# Altium footprint library ICL_komponenty_v1.PcbLib: 160 footprints (part 7 of 10)
Each footprint in its own frame and in the unit in brackets; x right, y up, seen from the top. Pads: shape width x height; smd on the part's side, far side on the other; paste and mask are expansions set on the pad; w line width, h text height; cw(c..) or ccw(c..) is an arc to the next point about the centre after c.
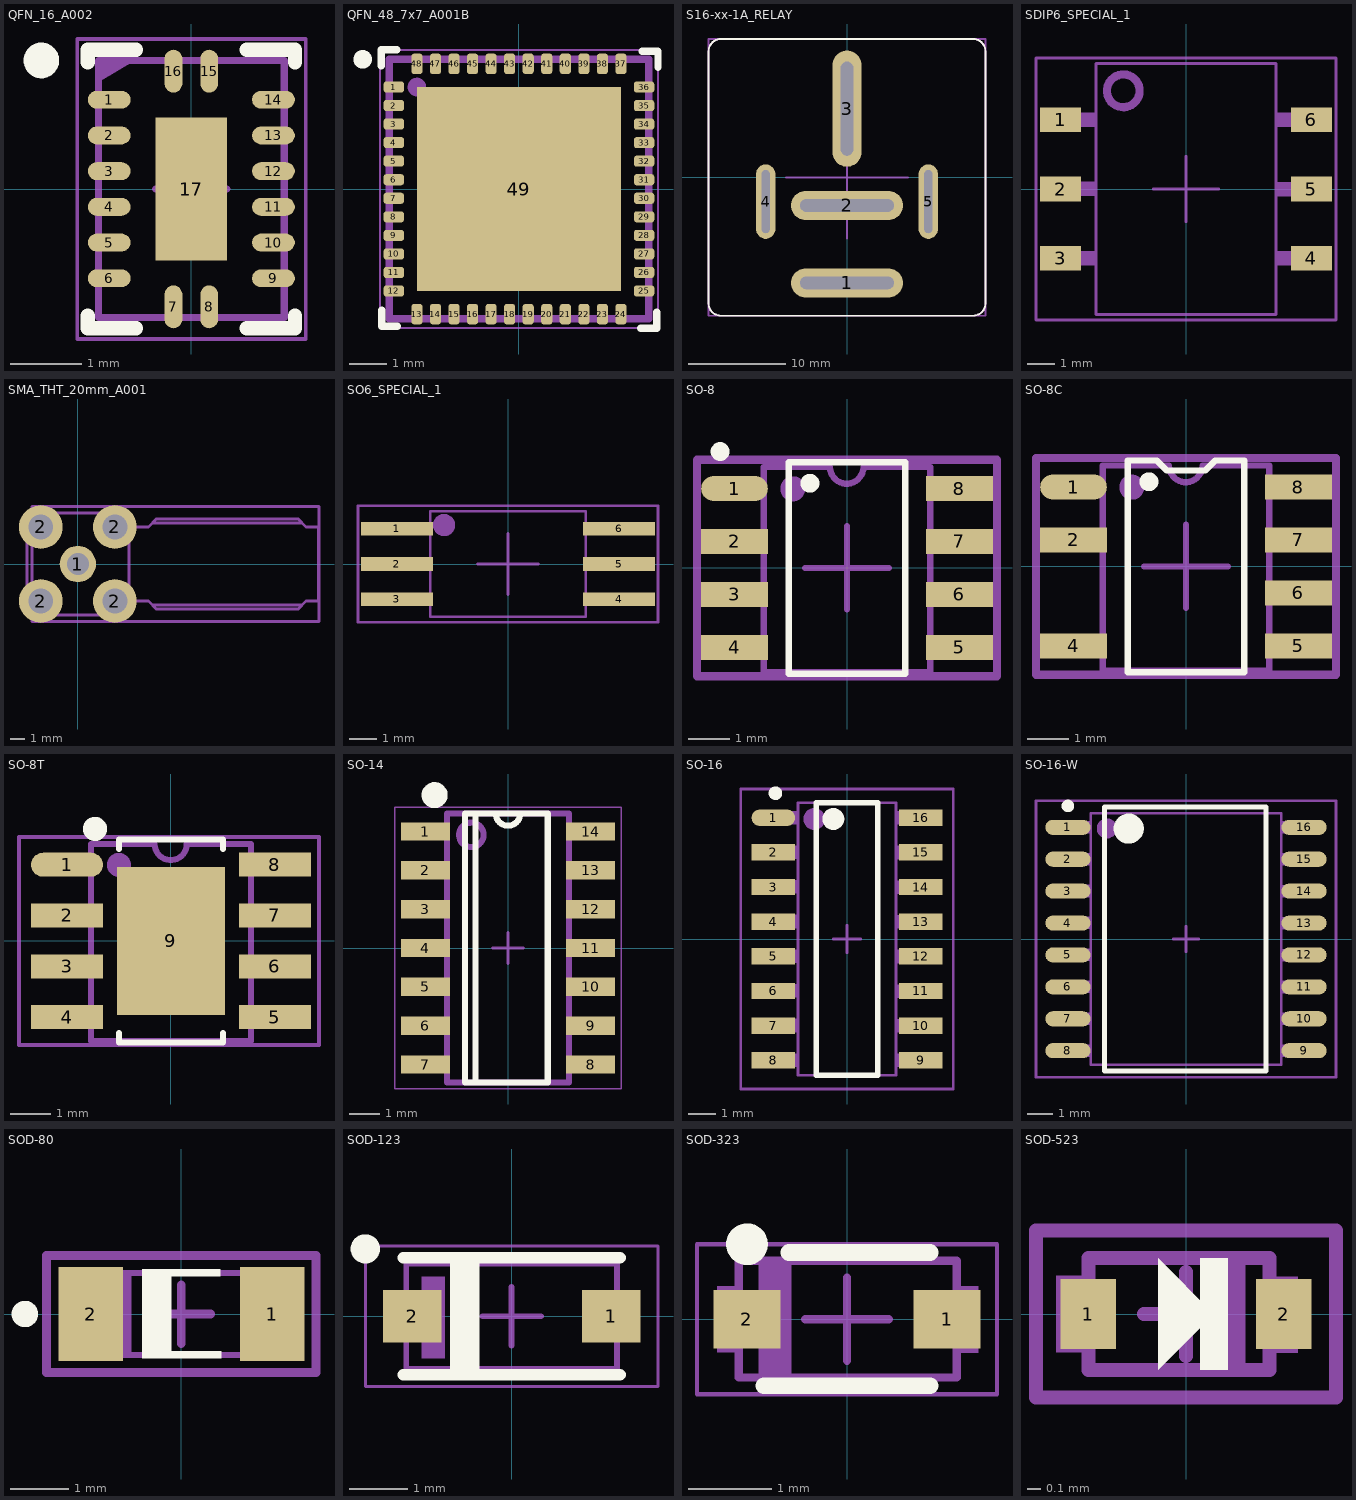
[diagram p6: the footprints below, top view; thin cyan lines are the x and y axes]

## QFN_16_A002 [mm] "QFN 16 for 74xx series"
height 0.8
pads (17):
  oval 0.6x0.25 smd: 1(-1.15,1.25) 2(-1.15,0.75) 3(-1.15,0.25) 4(-1.15,-0.25) 5(-1.15,-0.75) 6(-1.15,-1.25) 9(1.15,-1.25) 10(1.15,-0.75) 11(1.15,-0.25) 12(1.15,0.25) 13(1.15,0.75) 14(1.15,1.25)
  oval 0.25x0.6 smd: 7(-0.25,-1.65) 8(0.25,-1.65) 15(0.25,1.65) 16(-0.25,1.65)
  rect 1x2 smd: 17(0,0)
Top Overlay:
  circle w0.25: c-2.1,1.8 r0.125
  lines w0.2: -1.45,-1.775 -1.45,-1.95 -0.775,-1.95 ; -1.45,1.775 -1.45,1.95 -0.775,1.95 ; 0.775,-1.95 1.45,-1.95 1.45,-1.775 ; 0.775,1.95 1.45,1.95 1.45,1.775
Top M11-12_SMOT:
  region: -0.337,1.8 -0.337,1.5 -0.158,1.5 -0.158,1.8
  region: 0.163,1.8 0.163,1.5 0.342,1.5 0.342,1.8
  region: 1.3,1.337 1,1.337 1,1.158 1.3,1.158
  region: 1.3,0.837 1,0.837 1,0.658 1.3,0.658
  region: 1.3,0.337 1,0.337 1,0.158 1.3,0.158
  region: 1.3,-0.163 1,-0.163 1,-0.342 1.3,-0.342
  region: 1.3,-0.663 1,-0.663 1,-0.842 1.3,-0.842
  region: 1.3,-1.163 1,-1.163 1,-1.342 1.3,-1.342
  region: 0.337,-1.8 0.337,-1.5 0.158,-1.5 0.158,-1.8
  region: -0.163,-1.8 -0.163,-1.5 -0.342,-1.5 -0.342,-1.8
  rectangle: -1.3,-1.337 -1,-1.158
  rectangle: -1.3,-0.837 -1,-0.658
  rectangle: -1.3,-0.337 -1,-0.158
  rectangle: -1.3,0.163 -1,0.342
  rectangle: -1.3,0.663 -1,0.842
  rectangle: -1.3,1.163 -1,1.342
  region: -1.3,1.496 -0.783,1.8 -1.006,1.8 -1.3,1.8
  lines w0.1: -1.3,-1.8 -1.3,1.8 1.3,1.8 1.3,-1.8 -1.3,-1.8
Top M15-16_SORG:
  lines w0.05: -1.6,-2.1 -1.6,2.1 1.6,2.1 1.6,-2.1 -1.6,-2.1
  lines w0.1: -0.5,0 0.5,0 ; 0,-0.5 0,0.5
3D body "QFN_16_A002.step": height 0.8, standoff 0, extent -1.31,-1.81 1.31,1.81

## QFN_48_7x7_A001B [mm] "ST"
height 0.8
pads (49):
  rrect50% 0.55x0.3 smd paste-0.035 mask+0.1: 1(-3.375,2.75) 2(-3.375,2.25) 3(-3.375,1.75) 4(-3.375,1.25) 5(-3.375,0.75) 6(-3.375,0.25) 7(-3.375,-0.25) 8(-3.375,-0.75) 9(-3.375,-1.25) 10(-3.375,-1.75) 11(-3.375,-2.25) 12(-3.375,-2.75) 25(3.375,-2.75) 26(3.375,-2.25) 27(3.375,-1.75) 28(3.375,-1.25) 29(3.375,-0.75) 30(3.375,-0.25) 31(3.375,0.25) 32(3.375,0.75) 33(3.375,1.25) 34(3.375,1.75) 35(3.375,2.25) 36(3.375,2.75)
  rrect50% 0.3x0.55 smd paste-0.035 mask+0.1: 13(-2.75,-3.375) 14(-2.25,-3.375) 15(-1.75,-3.375) 16(-1.25,-3.375) 17(-0.75,-3.375) 18(-0.25,-3.375) 19(0.25,-3.375) 20(0.75,-3.375) 21(1.25,-3.375) 22(1.75,-3.375) 23(2.25,-3.375) 24(2.75,-3.375) 37(2.75,3.375) 38(2.25,3.375) 39(1.75,3.375) 40(1.25,3.375) 41(0.75,3.375) 42(0.25,3.375) 43(-0.25,3.375) 44(-0.75,3.375) 45(-1.25,3.375) 46(-1.75,3.375) 47(-2.25,3.375) 48(-2.75,3.375)
  rect 5.5x5.5 smd paste-2.75 mask+0.1: 49(0,0)
Top Overlay:
  circle w0.25: c-4.215,3.496 r0.125
  lines w0.2: -3.713,3.325 -3.713,3.75 -3.288,3.75 ; -3.7,-3.275 -3.7,-3.7 -3.275,-3.7 ; 3.287,-3.75 3.712,-3.75 3.712,-3.325 ; 3.325,3.712 3.75,3.712 3.75,3.287
Top Paste:
  rectangle: -2.5,1.25 -1.25,2.5
  region: -1.25,-2.5 -1.25,-1.25 -2.5,-1.25 -2.5,-2.5
  region: 2.5,-1.25 1.25,-1.25 1.25,-2.5 2.5,-2.5
  region: 1.25,2.5 1.25,1.25 2.5,1.25 2.5,2.5
  rectangle: -0.75,1.25 0.75,2.5
  region: -1.25,-0.75 -1.25,0.75 -2.5,0.75 -2.5,-0.75
  region: 0.75,-1.25 -0.75,-1.25 -0.75,-2.5 0.75,-2.5
  region: 1.25,0.75 1.25,-0.75 2.5,-0.75 2.5,0.75
  region: -0.75,0.75 -0.75,-0.75 0.75,-0.75 0.75,0.75
Top Solder:
  rectangle: 0.8,-0.8 1.8,0.8
  region: 0.8,0.8 0.8,1.8 -0.8,1.8 -0.8,0.8
  region: -0.8,0.8 -1.8,0.8 -1.8,-0.8 -0.8,-0.8
  region: -0.8,-0.8 -0.8,-1.8 0.8,-1.8 0.8,-0.8
  region: 0.974,1.118 0.974,1.114 0.976,1.088 0.997,1.038 1.035,1.001 1.084,0.98 1.111,0.978 1.1,0.978 1.1,0.7 0.6,0.7 0.6,1.119
  region: -1.118,0.974 -1.114,0.974 -1.088,0.976 -1.038,0.997 -1.001,1.035 -0.98,1.084 -0.978,1.111 -0.978,1.1 -0.7,1.1 -0.7,0.6 -1.119,0.6
  region: -0.974,-1.118 -0.974,-1.114 -0.976,-1.088 -0.997,-1.038 -1.035,-1.001 -1.084,-0.98 -1.111,-0.978 -1.1,-0.978 -1.1,-0.7 -0.6,-0.7 -0.6,-1.119
  region: 1.118,-0.974 1.114,-0.974 1.088,-0.976 1.038,-0.997 1.001,-1.035 0.98,-1.084 0.978,-1.111 0.978,-1.1 0.7,-1.1 0.7,-0.6 1.119,-0.6
Top M11-12_SMOT:
  circle w0.25: c-2.75,2.75 r0.125
  region: -2.65,-3.171 -2.85,-3.171 -2.85,-3.62 -2.65,-3.62
  region: -2.15,-3.171 -2.35,-3.171 -2.35,-3.62 -2.15,-3.62
  region: -1.65,-3.171 -1.85,-3.171 -1.85,-3.62 -1.65,-3.62
  region: -1.15,-3.171 -1.35,-3.171 -1.35,-3.62 -1.15,-3.62
  region: -0.65,-3.171 -0.85,-3.171 -0.85,-3.62 -0.65,-3.62
  region: -0.15,-3.171 -0.35,-3.171 -0.35,-3.62 -0.15,-3.62
  region: 0.35,-3.171 0.15,-3.171 0.15,-3.62 0.35,-3.62
  region: 0.85,-3.171 0.65,-3.171 0.65,-3.62 0.85,-3.62
  region: 1.35,-3.171 1.15,-3.171 1.15,-3.62 1.35,-3.62
  region: 1.85,-3.171 1.65,-3.171 1.65,-3.62 1.85,-3.62
  region: 2.35,-3.171 2.15,-3.171 2.15,-3.62 2.35,-3.62
  region: 2.85,-3.171 2.65,-3.171 2.65,-3.62 2.85,-3.62
  region: 3.171,-2.65 3.171,-2.85 3.62,-2.85 3.62,-2.65
  region: 3.171,-2.15 3.171,-2.35 3.62,-2.35 3.62,-2.15
  region: 3.171,-1.65 3.171,-1.85 3.62,-1.85 3.62,-1.65
  region: 3.171,-1.15 3.171,-1.35 3.62,-1.35 3.62,-1.15
  region: 3.171,-0.65 3.171,-0.85 3.62,-0.85 3.62,-0.65
  region: 3.171,-0.15 3.171,-0.35 3.62,-0.35 3.62,-0.15
  region: 3.171,0.35 3.171,0.15 3.62,0.15 3.62,0.35
  region: 3.171,0.85 3.171,0.65 3.62,0.65 3.62,0.85
  region: 3.171,1.35 3.171,1.15 3.62,1.15 3.62,1.35
  region: 3.171,1.85 3.171,1.65 3.62,1.65 3.62,1.85
  region: 3.171,2.35 3.171,2.15 3.62,2.15 3.62,2.35
  region: 3.171,2.85 3.171,2.65 3.62,2.65 3.62,2.85
  rectangle: 2.65,3.171 2.85,3.62
  rectangle: 2.15,3.171 2.35,3.62
  rectangle: 1.65,3.171 1.85,3.62
  rectangle: 1.15,3.171 1.35,3.62
  rectangle: 0.65,3.171 0.85,3.62
  rectangle: 0.15,3.171 0.35,3.62
  rectangle: -0.35,3.171 -0.15,3.62
  rectangle: -0.85,3.171 -0.65,3.62
  rectangle: -1.35,3.171 -1.15,3.62
  rectangle: -1.85,3.171 -1.65,3.62
  rectangle: -2.35,3.171 -2.15,3.62
  rectangle: -2.85,3.171 -2.65,3.62
  region: -3.171,2.65 -3.171,2.85 -3.62,2.85 -3.62,2.65
  region: -3.171,2.15 -3.171,2.35 -3.62,2.35 -3.62,2.15
  region: -3.171,1.65 -3.171,1.85 -3.62,1.85 -3.62,1.65
  region: -3.171,1.15 -3.171,1.35 -3.62,1.35 -3.62,1.15
  region: -3.171,0.65 -3.171,0.85 -3.62,0.85 -3.62,0.65
  region: -3.171,0.15 -3.171,0.35 -3.62,0.35 -3.62,0.15
  region: -3.171,-0.35 -3.171,-0.15 -3.62,-0.15 -3.62,-0.35
  region: -3.171,-0.85 -3.171,-0.65 -3.62,-0.65 -3.62,-0.85
  region: -3.171,-1.35 -3.171,-1.15 -3.62,-1.15 -3.62,-1.35
  region: -3.171,-1.85 -3.171,-1.65 -3.62,-1.65 -3.62,-1.85
  region: -3.171,-2.35 -3.171,-2.15 -3.62,-2.15 -3.62,-2.35
  region: -3.171,-2.85 -3.171,-2.65 -3.62,-2.65 -3.62,-2.85
  lines w0.2: -3.5,-3.5 3.5,-3.5 3.5,3.5 -3.5,3.5 -3.5,-3.5
Top M13-14_SDES:
  text "'.Designator'" at -4.532,-0.333 h0.8
Top M15-16_SORG:
  lines w0.05: -3.75,-3.75 3.75,-3.75 3.75,3.75 -3.75,3.75 -3.75,-3.75
  lines w0.1: -0.5,0 0.5,0 ; 0,-0.5 0,0.5
3D body "UFQFPN48.step": height 0.55, standoff 0, extent -3.5,-3.5 3.5,3.5

## S16-xx-1A_RELAY [mm] "Automotive Relay 80A NO"
pads (5):
  oval 11.6x3 hole 1.3 slot 9.7 at 0 deg: 1(0,-10.9) 2(0,-2.9)
  oval 3x12 hole 1.3 slot 9.7 at 90 deg: 3(0,7.1)
  oval 2x7.7 hole 0.8 slot 6.5 at 90 deg: 4(-8.4,-2.5) 5(8.4,-2.5)
Top Overlay:
  lines w0.2: -14.3,-13.03 ccw(c-13.03,-13.03) -13.03,-14.3 13.03,-14.3 ccw(c13.03,-13.03) 14.3,-13.03 14.3,13.03 ccw(c13.03,13.03) 13.03,14.3 -0.1,14.3 -13.03,14.3 ccw(c-13.03,13.03) -14.3,13.03 -14.3,-13.03
Top M17-18_TDES:
  text "'.Designator'" at -11.43,-16.733 h2
Top M19-20_TMOT:
  lines w0.2: -14.3,-13.03 ccw(c-13.03,-13.03) -13.03,-14.3 13.03,-14.3 ccw(c13.03,-13.03) 14.3,-13.03 14.3,13.03 ccw(c13.03,13.03) 13.03,14.3 -0.1,14.3 -13.03,14.3 ccw(c-13.03,13.03) -14.3,13.03 -14.3,-13.03
Top M25-26_TORG:
  lines w0.2: -6.3,0 0,0 ; 0,-6.3 0,0 ; 0,6.3 0,0 ; 6.3,0 0,0 ; -14.3,-14.3 -14.3,14.3 14.3,14.3 14.3,-14.3 -14.3,-14.3
3D body "relay_S16.stp": height 25.31, standoff -6.99, extent -14.3,-14.3 14.3,14.3

## SDIP6_SPECIAL_1 [mm] "multi transoptor footprint"
pads (6):
  rect 1.5x0.9 smd mask+0: 1(-4.6,2.54) 2(-4.6,0) 3(-4.6,-2.54) 4(4.6,-2.54) 5(4.6,0) 6(4.6,2.54)
Top M13-14_SDES:
  text "'.Designator'" at -4.532,-0.333 h0.8
Bottom M13-14_SDES:
  circle w0.3: c-2.3,3.6 r0.6
  region: -3.3,-2.269 -4.9,-2.269 -4.9,-2.8 -3.3,-2.8
  region: -3.3,0.271 -4.9,0.271 -4.9,-0.26 -3.3,-0.26
  region: -3.3,2.811 -4.9,2.811 -4.9,2.28 -3.3,2.28
  rectangle: 3.3,-2.811 4.9,-2.28
  rectangle: 3.3,-0.271 4.9,0.26
  rectangle: 3.3,2.269 4.9,2.8
  lines w0.1: -3.3,-4.6 3.3,-4.6 3.3,4.6 -3.3,4.6 -3.3,-4.6
Top M15-16_SORG:
  lines w0.1: -1.2,0 0,0 ; 0,-1.2 0,0 ; 0,1.2 0,0 ; 1.2,0 0,0 ; -5.5,-4.8 5.5,-4.8 5.5,4.8 -5.5,4.8 -5.5,-4.8
3D body "MOC8050SR2M.stp": height 5.16, standoff -0.07, extent -4.966,-4.496 4.966,4.484

## SMA_THT_20mm_A001 [mm]
pads (5):
  round 2.5 hole 1.5: 1(0,0)
  round 3 hole 1.7: 2(-2.54,-2.54) 2(-2.54,2.54) 2(2.54,-2.54) 2(2.54,2.54)
Top M17-18_TDES:
  text "'.Designator'" at -4.583,-5.915 h1
Top M19-20_TMOT:
  lines w0.2: 3.5,-2.54 4.84,-2.54 5.4,-3.1 15.1,-3.1 15.66,-2.54 16.5,-2.54 16.5,2.5 ; 3.5,2.54 4.84,2.54 5.4,3.1 15.1,3.1 15.66,2.54 16.5,2.54 ; 5.12,-2.82 15.38,-2.82 ; 5.12,2.82 15.38,2.82 ; -3.5,-3.5 -3.5,3.5 3.5,3.5 3.5,-3.5 -3.5,-3.5
Top M25-26_TORG:
  lines w0.2: -3.15,-3.95 -1.35,-3.95 16.55,-3.95 16.55,3.05 16.55,3.95 -3.15,3.95 -3.15,-3.95
3D body "SMA_THT_20mm_60311042114502_rev1.STEP": height 10.47, standoff -3.93, extent -3.16,-3.96 16.53,3.96

## SO6_SPECIAL_1 [mm] "multi transoptor footprint"
pads (6):
  rect 2.6x0.5 smd mask+0: 1(-4,1.27) 2(-4,0) 3(-4,-1.27) 4(4,-1.27) 5(4,0) 6(4,1.27)
Top M11-12_SMOT:
  circle w0.4: c-2.3,1.4 r0.2
  region: -2.8,-1.1 -4,-1.1 -4,-1.426 -2.8,-1.426
  region: -2.8,1.44 -4,1.44 -4,1.114 -2.8,1.114
  rectangle: 2.8,-1.44 4,-1.114
  rectangle: 2.8,-0.17 4,0.156
  rectangle: 2.8,1.1 4,1.426
  lines w0.1: -2.8,-1.9 -2.8,1.9 2.8,1.9 2.8,-1.9 -2.8,-1.9
Top M13-14_SDES:
  text "'.Designator'" at -4.532,-0.333 h0.8
Top M15-16_SORG:
  lines w0.1: -1.1,0 0,0 ; 0,-1.1 0,0 ; 0,1.1 0,0 ; 1.1,0 0,0 ; -5.4,-2.1 5.4,-2.1 5.4,2.1 -5.4,2.1 -5.4,-2.1
3D body "TLP2362.step": height 2.2, standoff 0, extent -3.414,-1.9 3.614,1.9

## SO-8 [mm]
pads (8):
  oval 1.6x0.6 smd: 1(-2.7,1.905)
  rect 1.6x0.6 smd: 2(-2.7,0.635) 3(-2.7,-0.635) 4(-2.7,-1.905) 5(2.7,-1.905) 6(2.7,-0.635) 7(2.7,0.635) 8(2.7,1.905)
Top Overlay:
  circle w0.25: c-0.889,2.032 r0.1
  circle w0.25: c-3.048,2.794 r0.1
  lines w0.152: -1.397,-2.54 -1.397,2.54 1.397,2.54 1.397,-2.54 -1.397,-2.54
Top M11-12_SMOT:
  circle w0.3: c-1.3,1.9 r0.15
  rectangle: -2.8,-0.834 -2,-0.433
  rectangle: -2.8,0.433 -2,0.833
  region: 2.8,-0.444 2,-0.444 2,-0.845 2.8,-0.845
  region: 2.8,0.856 2,0.856 2,0.455 2.8,0.455
  rectangle: -2.8,-2.1 -2,-1.699
  rectangle: -2.8,1.644 -2,2.144
  region: 2.8,-1.733 2,-1.733 2,-2.133 2.8,-2.133
  region: 2.8,2.112 2,2.112 2,1.71 2.8,1.71
  lines w0.15: -2,-2.5 -2,2.42 -0.407,2.42 ccw(c-0.007,2.42) 0.393,2.42 2,2.42 2,-2.5 -2,-2.5
Top M13-14_SDES:
  text "'.Designator'" at -5.665,-0.417 h1
Top M15-16_SORG:
  lines w0.15: -1,0 0,0 ; 0,-1 0,0 ; 0,1 0,0 ; 1,0 0,0
  lines w0.2: -3.6,-2.6 3.6,-2.6 3.6,2.6 -3.6,2.6 -3.6,-2.6
3D body "SO-8.STEP": height 1.89, standoff -0.01, extent -3.144,-2.515 3.195,2.489

## SO-8C [mm] "Power Integration"
pads (7):
  oval 1.6x0.6 smd: 1(-2.7,1.905)
  rect 1.6x0.6 smd: 2(-2.7,0.635) 4(-2.7,-1.905) 5(2.7,-1.905) 6(2.7,-0.635) 7(2.7,0.635) 8(2.7,1.905)
Top Overlay:
  circle w0.25: c-0.889,2.032 r0.1
  lines w0.152: -1.397,-2.54 1.397,-2.54 1.397,2.54 0.699,2.54 0.459,2.3 -0.459,2.3 -0.699,2.54 -1.397,2.54 -1.397,-2.54
Top M11-12_SMOT:
  circle w0.3: c-1.3,1.9 r0.15
  region: 2.8,2.112 2,2.112 2,1.71 2.8,1.71
  region: 2.8,-1.733 2,-1.733 2,-2.133 2.8,-2.133
  rectangle: -2.8,1.644 -2,2.144
  rectangle: -2.8,-2.1 -2,-1.699
  region: 2.8,0.856 2,0.856 2,0.455 2.8,0.455
  region: 2.8,-0.444 2,-0.444 2,-0.845 2.8,-0.845
  rectangle: -2.8,0.433 -2,0.833
  lines w0.15: -2,-2.5 2,-2.5 2,2.42 0.393,2.42 cw(c-0.007,2.42) -0.407,2.42 -2,2.42 -2,-2.5
Top M13-14_SDES:
  text "'.Designator'" at -5.665,-0.417 h1
Top M15-16_SORG:
  lines w0.15: -1,0 0,0 ; 0,-1 0,0 ; 0,1 0,0 ; 1,0 0,0
  lines w0.2: -3.6,-2.6 -3.6,2.6 3.6,2.6 3.6,-2.6 -3.6,-2.6
3D body "SO-8.STEP": height 1.89, standoff -0.01, extent -3.144,-2.515 3.195,2.489

## SO-8T [mm]
pads (9):
  oval 1.8x0.6 smd: 1(-2.6,1.905)
  rect 1.8x0.6 smd: 2(-2.6,0.635) 3(-2.6,-0.635) 4(-2.6,-1.905) 5(2.6,-1.905) 6(2.6,-0.635) 7(2.6,0.635) 8(2.6,1.905)
  rect 2.7x3.7 smd paste-0.2: 9(0,0)
Top Overlay:
  circle w0.4: c-1.9,2.8 r0.1
  lines w0.152: -1.3,-2.3 -1.3,-2.54 1.3,-2.54 1.3,-2.3 ; -1.3,2.3 -1.3,2.54 1.3,2.54 1.3,2.3
Top M11-12_SMOT:
  circle w0.3: c-1.3,1.9 r0.15
  region: 2.8,2.112 2,2.112 2,1.71 2.8,1.71
  region: 2.8,-1.733 2,-1.733 2,-2.133 2.8,-2.133
  rectangle: -2.8,1.644 -2,2.144
  rectangle: -2.8,-2.1 -2,-1.699
  region: 2.8,0.856 2,0.856 2,0.455 2.8,0.455
  region: 2.8,-0.444 2,-0.444 2,-0.845 2.8,-0.845
  rectangle: -2.8,0.433 -2,0.833
  rectangle: -2.8,-0.834 -2,-0.433
  lines w0.15: -2,-2.5 2,-2.5 2,2.42 0.393,2.42 cw(c-0.007,2.42) -0.407,2.42 -2,2.42 -2,-2.5
Top M13-14_SDES:
  text "'.Designator'" at -5.665,-0.417 h1
Top M15-16_SORG:
  lines w0.1: -1,0 0,0 ; 0,-1 0,0 ; 0,1 0,0 ; 1,0 0,0 ; -3.8,-2.6 3.7,-2.6 3.7,2.6 -3.8,2.6 -3.8,-2.6
3D body "SO-8.STEP": height 1.89, standoff -0.01, extent -3.144,-2.515 3.195,2.489

## SO-14 [mm]
height 1.75
pads (14):
  rect 1.6x0.6 smd: 1(-2.7,3.81) 2(-2.7,2.54) 3(-2.7,1.27) 4(-2.7,0) 5(-2.7,-1.27) 6(-2.7,-2.54) 7(-2.7,-3.81) 8(2.7,-3.81) 9(2.7,-2.54) 10(2.7,-1.27) 11(2.7,0) 12(2.7,1.27) 13(2.7,2.54) 14(2.7,3.81)
Top Overlay:
  circle w0.45: c-2.4,5 r0.2
  lines w0.2: -1.062,-4.4 -1.062,4.4 ; -0.4,4.4 ccw(c0,4.4) 0.4,4.4 ; -1.4,-4.4 1.3,-4.4 1.3,4.4 -1.4,4.4 -1.4,-4.4
Top M11-12_SMOT:
  circle w0.2: c-1.2,3.7 r0.4
  region: 3,4.02 2,4.02 2,3.606 3,3.606
  region: 3,2.75 2,2.75 2,2.336 3,2.336
  region: 3,1.48 2,1.48 2,1.066 3,1.066
  region: 3,0.21 2,0.21 2,-0.204 3,-0.204
  region: 3,-1.06 2,-1.06 2,-1.474 3,-1.474
  region: 3,-2.33 2,-2.33 2,-2.744 3,-2.744
  region: 3,-2.33 2,-2.33 2,-2.744 3,-2.744
  region: 3,-3.6 2,-3.6 2,-4.014 3,-4.014
  rectangle: -3,-4.02 -2,-3.606
  rectangle: -3,-2.75 -2,-2.336
  rectangle: -3,-1.48 -2,-1.066
  rectangle: -3,-0.21 -2,0.204
  rectangle: -3,1.06 -2,1.474
  rectangle: -3,2.33 -2,2.744
  rectangle: -3,3.6 -2,4.014
  lines w0.2: -2,-4.4 2,-4.4 2,4.4 -2,4.4 -2,-4.4
Top M13-14_SDES:
  text "'.Designator'" at 0.417,-5.665 h1
Top M15-16_SORG:
  lines w0.05: -3.7,-4.6 3.7,-4.6 3.7,4.6 -3.7,4.6 -3.7,-4.6
  lines w0.1: -0.5,0 0.5,0 ; 0,-0.5 0,0.5
3D body "SO-14.step": height 1.61, standoff 0.01, extent -2.995,-4.345 2.995,4.345

## SO-16 [mm] "SOIC, 16-Leads, Body 10,0x4,0mm (max), Pitch 1,27mm, IPC Low Density"
height 1.75
pads (16):
  oval 1.6x0.6 smd: 1(-2.7,4.445)
  rect 1.6x0.6 smd: 2(-2.7,3.175) 3(-2.7,1.905) 4(-2.7,0.635) 5(-2.7,-0.635) 6(-2.7,-1.905) 7(-2.7,-3.175) 8(-2.7,-4.445) 9(2.7,-4.445) 10(2.7,-3.175) 11(2.7,-1.905) 12(2.7,-0.635) 13(2.7,0.635) 14(2.7,1.905) 15(2.7,3.175) 16(2.7,4.445)
Top Overlay:
  circle w0.25: c-2.625,5.345 r0.125
  circle w0.4: c-0.5,4.4 r0.2
  lines w0.2: -1.125,-5 -1.125,5 1.125,5 1.125,-5 -1.125,-5
Top M11-12_SMOT:
  circle w0.4: c-1.2,4.4 r0.2
  region: 2.9,2.15 1.8,2.15 1.8,1.65 2.9,1.65
  region: 2.9,-1.66 1.8,-1.66 1.8,-2.16 2.9,-2.16
  rectangle: -2.9,1.66 -1.8,2.16
  rectangle: -2.9,-2.15 -1.8,-1.65
  region: 2.9,4.69 1.8,4.69 1.8,4.19 2.9,4.19
  region: 2.9,3.42 1.8,3.42 1.8,2.92 2.9,2.92
  region: 2.9,0.88 1.8,0.88 1.8,0.38 2.9,0.38
  region: 2.9,-0.39 1.8,-0.39 1.8,-0.89 2.9,-0.89
  region: 2.9,-2.93 1.8,-2.93 1.8,-3.43 2.9,-3.43
  region: 2.9,-4.2 1.8,-4.2 1.8,-4.7 2.9,-4.7
  rectangle: -2.9,4.2 -1.8,4.7
  rectangle: -2.9,2.93 -1.8,3.43
  rectangle: -2.9,0.39 -1.8,0.89
  rectangle: -2.9,-0.88 -1.8,-0.38
  rectangle: -2.9,-3.42 -1.8,-2.92
  rectangle: -2.9,-4.69 -1.8,-4.19
  lines w0.1: -1.8,-5 1.8,-5 1.8,5 -1.8,5 -1.8,-5
Top M13-14_SDES:
  text "'.Designator'" at 0.333,-4.532 h0.8
Top M15-16_SORG:
  lines w0.1: -0.5,0 0.5,0 ; 0,-0.5 0,0.5 ; -3.9,-5.5 -3.9,5.5 3.9,5.5 3.9,-5.5 -3.9,-5.5
3D body "SO-16.step": height 1.45, standoff 0, extent -2.857,-4.991 3.048,4.991

## SO-16-W [mm]
height 2
pads (16):
  oval 1.8x0.6 smd: 1(-4.7,4.445) 2(-4.7,3.175) 3(-4.7,1.905) 4(-4.7,0.635) 5(-4.7,-0.635) 6(-4.7,-1.905) 7(-4.7,-3.175) 8(-4.7,-4.445) 9(4.7,-4.445) 10(4.7,-3.175) 11(4.7,-1.905) 12(4.7,-0.635) 13(4.7,0.635) 14(4.7,1.905) 15(4.7,3.175) 16(4.7,4.445)
Top Overlay:
  circle w0.6: c-2.281,4.394 r0.3
  circle w0.25: c-4.7,5.295 r0.125
  lines w0.2: -3.251,-5.25 3.175,-5.25 3.175,5.25 -3.251,5.25 -3.251,-5.25
Top M11-12_SMOT:
  circle w0.4: c-3.15,4.4 r0.2
  rectangle: -4.9,-4.69 -3.8,-4.19
  rectangle: -4.9,-3.42 -3.8,-2.92
  rectangle: -4.9,-0.88 -3.8,-0.38
  rectangle: -4.9,0.39 -3.8,0.89
  rectangle: -4.9,2.93 -3.8,3.43
  rectangle: -4.9,4.2 -3.8,4.7
  region: 4.9,-4.2 3.8,-4.2 3.8,-4.7 4.9,-4.7
  region: 4.9,-2.93 3.8,-2.93 3.8,-3.43 4.9,-3.43
  region: 4.9,-0.39 3.8,-0.39 3.8,-0.89 4.9,-0.89
  region: 4.9,0.88 3.8,0.88 3.8,0.38 4.9,0.38
  region: 4.9,3.42 3.8,3.42 3.8,2.92 4.9,2.92
  region: 4.9,4.69 3.8,4.69 3.8,4.19 4.9,4.19
  rectangle: -4.9,-2.15 -3.8,-1.65
  rectangle: -4.9,1.66 -3.8,2.16
  region: 4.9,-1.66 3.8,-1.66 3.8,-2.16 4.9,-2.16
  region: 4.9,2.15 3.8,2.15 3.8,1.65 4.9,1.65
  lines w0.1: -3.8,-5 -3.8,5 3.8,5 3.8,-5 -3.8,-5
Top M13-14_SDES:
  text "'.Designator'" at 0.367,-5.665 h1
Top M15-16_SORG:
  lines w0.1: -0.5,0 0.5,0 ; 0,-0.5 0,0.5 ; -5.969,-5.5 5.969,-5.5 5.969,5.5 -5.969,5.5 -5.969,-5.5
3D body "so16w.step": height 3.5, standoff 0, extent -5.15,-5.171 5.15,5.029

## SOD-80 [mm] "miniMELF"
pads (2):
  rect 1.1x1.6 smd: 1(1.55,0) 2(-1.54,0)
Top Overlay:
  circle w0.25: c-2.667,0 r0.1
  rectangle: -0.518,-0.76 0.69,-0.633
  rectangle: -0.538,0.642 0.67,0.769
  rectangle: -0.672,-0.758 -0.164,0.766
Top M11-12_SMOT:
  region: 1.787,0.676 1.506,0.676 1.506,-0.758 1.787,-0.758
  region: -0.848,0.687 -1.248,0.687 -1.248,-0.713 -0.848,-0.713
  rectangle: -1.781,-0.7 -1.5,0.733
  lines w0.1: -1.77,-0.7 1.8,-0.7 1.8,0.7 -1.77,0.7 -1.77,-0.7
Top M13-14_SDES:
  text "'.Designator'" at -3.565,-0.292 h0.7
Top M15-16_SORG:
  lines w0.15: -0.5,0 0,0 0,0.5 ; -0.001,-0.001 0.499,-0.001 ; 0,-0.501 0,-0.001 ; -2.3,-1 2.3,-1 2.3,1 -2.3,1 -2.3,-1
3D body "minimelf.step": height 1.4, standoff 0, extent -1.725,-0.686 1.775,0.714

## SOD-123 [mm] "SOD-123"
height 1.4
pads (2):
  rect 1x0.9 smd: 1(1.7,0) 2(-1.7,0)
Top Overlay:
  circle w0.25: c-2.5,1.15 r0.125
  rectangle: -1.05,-1 -0.55,1
  lines w0.2: -1.85,-1 1.85,-1 ; -1.85,1 1.85,1
Top M11-12_SMOT:
  rectangle: -1.539,-0.723 -1.139,0.675
  rectangle: -2.1,-0.4 -1.8,0.4
  region: 2.15,0.4 1.75,0.4 1.75,-0.405 2.15,-0.405
  lines w0.1: -1.8,-0.9 -1.8,0.9 1.8,0.9 1.8,-0.9 -1.8,-0.9
Top M13-14_SDES:
  text "'.Designator'" at -4.065,-0.192 h0.7
Top M15-16_SORG:
  lines w0.05: -2.5,-1.2 2.5,-1.2 2.5,1.2 -2.5,1.2 -2.5,-1.2
  lines w0.1: -0.5,0 0.5,0 ; 0,-0.5 0,0.5
3D body "SOD-123FL CASE 498.step": height 0.96, standoff 0.01, extent -1.8,-0.825 1.8,0.825

## SOD-323 [mm] "SOD-323"
height 1.4
pads (2):
  rect 0.8x0.7 smd: 1(1.2,0) 2(-1.2,0)
Top Overlay:
  circle w0.25: c-1.2,0.9 r0.125
  lines w0.2: -1,-0.8 1,-0.8 ; -0.7,0.8 1,0.8
Top M11-12_SMOT:
  region: 1.577,0.4 1.318,0.4 1.318,-0.405 1.577,-0.405
  rectangle: -1.558,-0.402 -1.3,0.398
  rectangle: -1.065,-0.712 -0.665,0.686
  lines w0.1: -1.3,-0.7 1.318,-0.7 1.318,0.7 -1.3,0.7 -1.3,-0.7
Top M13-14_SDES:
  text "'.Designator'" at -2.632,-0.208 h0.5
Top M15-16_SORG:
  lines w0.05: -1.8,-0.9 1.8,-0.9 1.8,0.9 -1.8,0.9 -1.8,-0.9
  lines w0.1: -0.5,0 0.5,0 ; 0,-0.5 0,0.5
3D body "SOD323-1.step": height 1.11, standoff 0.01, extent -1.3,-0.675 1.3,0.675

## SOD-523 [mm] "SC-79"
pads (2):
  rect 0.4x0.5 smd: 1(-0.7,0) 2(0.7,0)
Top Overlay:
  rectangle: 0.1,-0.4 0.3,0.4
  region: 0.2,0 -0.2,0.4 -0.2,-0.4
Top M11-12_SMOT:
  region: 0.802,0.27 0.623,0.27 0.623,-0.279 0.802,-0.279
  region: 0.425,0.4 0.2,0.4 0.2,-0.4 0.425,-0.4
  rectangle: -0.932,-0.275 -0.707,0.278
  lines w0.1: -0.7,-0.4 0.6,-0.4 0.6,0.4 -0.7,0.4 -0.7,-0.4
Top M13-14_SDES:
  text "'.Designator'" at -2.316,0.733 h0.4
Top M15-16_SORG:
  lines w0.1: -0.3,0 0,0 ; 0,-0.3 0,0 ; 0,0.3 0,0 ; 0.3,0 0,0 ; -1.075,-0.6 1.075,-0.6 1.075,0.6 -1.075,0.6 -1.075,-0.6
3D body "SOD523-1.step": height 0.71, standoff 0.01, extent -0.8,-0.399 0.8,0.399